# Altium footprint library EMDC_Packages.PcbLib: 274 footprints (part 5 of 18)
Each footprint in its own frame and in the unit in brackets; x right, y up, seen from the top. Pads: shape width x height; smd on the part's side, far side on the other; paste and mask are expansions set on the pad; w line width, h text height; cw(c..) or ccw(c..) is an arc to the next point about the centre after c.
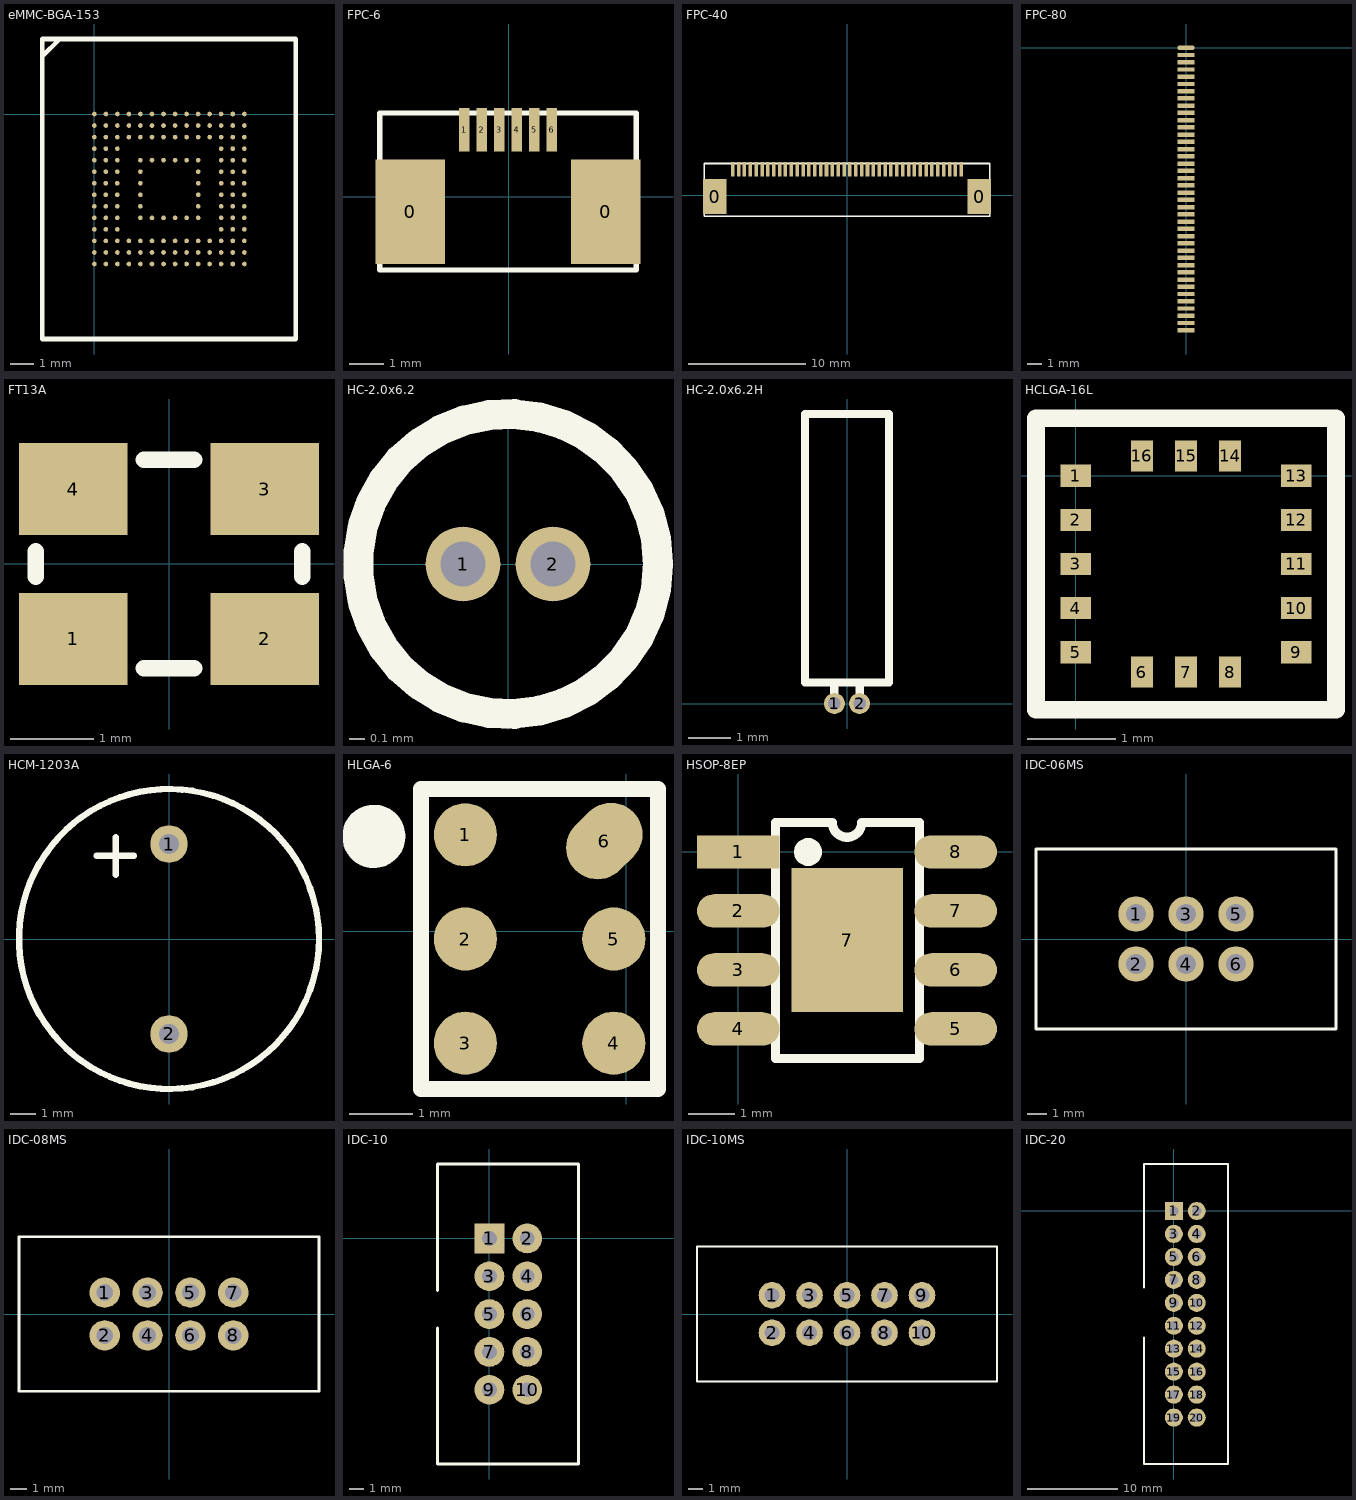
[diagram p4: the footprints below, top view; thin cyan lines are the x and y axes]

## eMMC-BGA-153 [mm]
pads (152):
  round 0.2 smd: A1(0,0) A2(0.5,0) A3(1,0) A4(1.5,0) A5(2,0) A6(2.5,0) A7(3,0) A8(3.5,0) A9(4,0) A10(4.5,0) A11(5,0) A12(5.5,0) A13(6,0) A14(6.5,0) B1(0,-0.5) B2(0.5,-0.5) B3(1,-0.5) B4(1.5,-0.5) B5(2,-0.5) B6(2.5,-0.5) B7(3,-0.5) B8(3.5,-0.5) B9(4,-0.5) B10(4.5,-0.5) B11(5,-0.5) B12(5.5,-0.5) B13(6,-0.5) B14(6.5,-0.5) C1(0,-1) C2(0.5,-1) C3(1,-1) C4(1.5,-1) C5(2,-1) C6(2.5,-1) C7(3,-1) C8(3.5,-1) C9(4,-1) C10(4.5,-1) C11(5,-1) C12(5.5,-1) C13(6,-1) C14(6.5,-1) D1(0,-1.5) D2(0.5,-1.5) D3(1,-1.5) D12(5.5,-1.5) D13(6,-1.5) D14(6.5,-1.5) E1(0,-2) E2(0.5,-2) E3(1,-2) E5(2,-2) E6(2.5,-2) E7(3,-2) E8(3.5,-2) E9(4,-2) E10(4.5,-2) E12(5.5,-2) E13(6,-2) E14(6.5,-2) F1(0,-2.5) F2(0.5,-2.5) F3(1,-2.5) F5(2,-2.5) F10(4.5,-2.5) F12(5.5,-2.5) F13(6,-2.5) F14(6.5,-2.5) G1(0,-3) G2(0.5,-3) G3(1,-3) G5(2,-3) G10(4.5,-3) G12(5.5,-3) G13(6,-3) G14(6.5,-3) H1(0,-3.5) H2(0.5,-3.5) H3(1,-3.5) H5(2,-3.5) H10(4.5,-3.5) H12(5.5,-3.5) H13(6,-3.5) H14(6.5,-3.5) J1(0,-4) J2(0.5,-4) J3(1,-4) J5(2,-4) J10(4.5,-4) J12(5.5,-4) J13(6,-4) J14(6.5,-4) K1(0,-4.5) K2(0.5,-4.5) K3(1,-4.5) K5(2,-4.5) K6(2.5,-4.5) K7(3,-4.5) K8(3.5,-4.5) K9(4,-4.5) K10(4.5,-4.5) K12(5.5,-4.5) K13(6,-4.5) K14(6.5,-4.5) L1(0,-5) L2(0.5,-5) L3(1,-5) L12(5.5,-5) L13(6,-5) L14(6.5,-5) M1(0,-5.5) M2(0.5,-5.5) M3(1,-5.5) M4(1.5,-5.5) M5(2,-5.5) M6(2.5,-5.5) M7(3,-5.5) M8(3.5,-5.5) M9(4,-5.5) M10(4.5,-5.5) M11(5,-5.5) M12(5.5,-5.5) M13(6,-5.5) M14(6.5,-5.5) N1(0,-6) N2(0.5,-6) N3(1,-6) N4(1.5,-6) N5(2,-6) N6(2.5,-6) N7(3,-6) N8(3.5,-6) N9(4,-6) N10(4.5,-6) N11(5,-6) N12(5.5,-6) N13(6,-6) N14(6.5,-6) P1(0,-6.5) P2(0.5,-6.5) P3(1,-6.5) P4(1.5,-6.5) P5(2,-6.5) P6(2.5,-6.5) P7(3,-6.5) P8(3.5,-6.5) P9(4,-6.5) P10(4.5,-6.5) P11(5,-6.5) P12(5.5,-6.5) P13(6,-6.5) P14(6.5,-6.5)
Top Overlay:
  lines w0.2: -2.25,2.5 -1.5,3.25 ; -2.25,3.25 -2.25,3.25 ; -2.25,3.25 8.725,3.25 8.725,-9.75 -2.25,-9.75 -2.25,3.25
3D body "User Library-FBGA64 11x13.step": height 1.4, standoff 0, extent -2.25,-9.75 8.75,3.25

## FPC-6 [mm]
pads (8):
  rect 2x3 smd: 0(-2.825,-0.425) 0(2.775,-0.425)
  rect 0.3x1.25 smd: 1(-1.275,1.925) 2(-0.775,1.925) 3(-0.275,1.925) 4(0.225,1.925) 5(0.725,1.925) 6(1.225,1.925)
Top Overlay:
  lines w0.15: -3.7,2.4 -3.7,2.4 ; -3.7,2.4 -3.7,-2.1 3.65,-2.1 3.65,2.4 -3.7,2.4
3D body "31826.stp": height 1.03, standoff 0.03, extent -2.525,-1.4 2.475,2.4

## FPC-40 [mm]
pads (42):
  rect 2x3 smd: 0(-11.325,-0.1) 0(11.275,-0.1)
  rect 0.3x1.25 smd: 1(-9.775,2.25) 2(-9.275,2.25) 3(-8.775,2.25) 4(-8.275,2.25) 5(-7.775,2.25) 6(-7.275,2.25) 7(-6.775,2.25) 8(-6.275,2.25) 9(-5.775,2.25) 10(-5.275,2.25) 11(-4.775,2.25) 12(-4.275,2.25) 13(-3.775,2.25) 14(-3.275,2.25) 15(-2.775,2.25) 16(-2.275,2.25) 17(-1.775,2.25) 18(-1.275,2.25) 19(-0.775,2.25) 20(-0.275,2.25) 21(0.225,2.25) 22(0.725,2.25) 23(1.225,2.25) 24(1.725,2.25) 25(2.225,2.25) 26(2.725,2.25) 27(3.225,2.25) 28(3.725,2.25) 29(4.225,2.25) 30(4.725,2.25) 31(5.225,2.25) 32(5.725,2.25) 33(6.225,2.25) 34(6.725,2.25) 35(7.225,2.25) 36(7.725,2.25) 37(8.225,2.25) 38(8.725,2.25) 39(9.225,2.25) 40(9.725,2.25)
Top Overlay:
  lines w0.15: -12.2,2.725 -12.2,2.725 ; -12.2,2.725 -12.2,-1.775 12.15,-1.775 ; -12.2,2.725 12.15,2.725 12.15,-1.775 ; 12.15,-1.775 12.15,-1.775
3D body "31805.stp": height 2.5, standoff -0.05, extent -12.5,-4.35 12.4,2.85

## FPC-80 [mm]
pads (40):
  oval 1.2x0.3 smd: 1(0,0)
  rect 1.2x0.3 smd: 2(0,-0.5) 3(0,-1) 4(0,-1.5) 5(0,-2) 6(0,-2.5) 7(0,-3) 8(0,-3.5) 9(0,-4) 10(0,-4.5) 11(0,-5) 12(0,-5.5) 13(0,-6) 14(0,-6.5) 15(0,-7) 16(0,-7.5) 17(0,-8) 18(0,-8.5) 19(0,-9) 20(0,-9.5) 21(0,-10) 22(0,-10.5) 23(0,-11) 24(0,-11.5) 25(0,-12) 26(0,-12.5) 27(0,-13) 28(0,-13.5) 29(0,-14) 30(0,-14.5) 31(0,-15) 32(0,-15.5) 33(0,-16) 34(0,-16.5) 35(0,-17) 36(0,-17.5) 37(0,-18) 38(0,-18.5) 39(0,-19) 40(0,-19.5)

## FT13A [mm] "Quartz crystal FT13A package"
pads (4):
  rect 1.3x1.1 smd: 1(-1.15,-0.9) 2(1.15,-0.9) 3(1.15,0.9) 4(-1.15,0.9)
Top Overlay:
  lines w0.2: -1.6,-0.15 -1.6,0.15 ; -0.3,-1.25 0.3,-1.25 ; -0.3,1.25 0.3,1.25 ; 1.6,-0.15 1.6,0.15
3D body: height 0.7, standoff 0, extent -1.599,-1.249 1.599,1.249

## HC-2.0x6.2 [mm]
pads (2):
  round 0.5 hole 0.3: 1(-0.3,0) 2(0.3,0)
Top Overlay:
  circle w0.2: c0,0 r1
3D body: height 6.2, standoff 0, extent -1,-0.999 1,0.999

## HC-2.0x6.2H [mm]
pads (2):
  round 0.5 hole 0.3: 1(-0.3,0) 2(0.3,0)
Top Overlay:
  lines w0.2: -0.3,0 -0.3,0.5 ; 0.3,0 0.3,0.5 ; -1,0.5 1,0.5 1,6.9 -1,6.9 -1,0.5
3D body: height 1, standoff 0, extent 0.1,-0.2 0.5,0.2
3D body: height 1, standoff 0, extent -0.5,-0.2 -0.1,0.2
3D body: height 1.2, standoff 0.8, extent 0.1,0.1 0.5,0.6
3D body: height 1.2, standoff 0.8, extent -0.5,0.1 -0.1,0.6
3D body: height 2, standoff 0, extent -0.9,0.6 1.1,6.8
3D body: height 1.2, standoff 0.71, extent -0.5,-0.141 -0.1,0.353
3D body: height 1.2, standoff 0.71, extent 0.1,-0.141 0.5,0.353

## HCLGA-16L [mm]
pads (16):
  rect 0.35x0.25 smd: 1(0,0) 2(0,-0.5) 3(0,-1) 4(0,-1.5) 5(0,-2) 9(2.5,-2) 10(2.5,-1.5) 11(2.5,-1) 12(2.5,-0.5) 13(2.5,0)
  rect 0.25x0.35 smd: 6(0.75,-2.225) 7(1.25,-2.225) 8(1.75,-2.225) 14(1.75,0.225) 15(1.25,0.225) 16(0.75,0.225)
Top Overlay:
  lines w0.2: -0.45,-2.65 2.95,-2.65 2.95,0.65 -0.45,0.65 -0.45,-2.65
3D body "User Library-LIS331AL.STEP": height 1.01, standoff -0.01, extent -0.25,-2.5 2.75,0.5

## HCM-1203A [mm] "Buzzer"
pads (2):
  round 1.5 hole 0.8: 1(0,3.8) 2(0,-3.8)
Top Overlay:
  circle w0.254: c0,0 r6
  lines w0.254: -2.9,3.325 -1.4,3.325 ; -2.125,2.575 -2.125,4.075
3D body "User Library-HCM1206X.STEP": height 9.5, standoff -6.5, extent -6,-6 6,6

## HLGA-6 [mm]
pads (6):
  round 1 smd: 1(-2.55,1.525) 2(-2.55,-0.125) 3(-2.55,-1.775) 4(-0.2,-1.775) 5(-0.2,-0.125)
  oval 1x1.3 smd rot 135: 6(-0.35,1.425)
Top Overlay:
  circle w0.5: c-4,1.5 r0.25
  lines w0.254: -3.25,-2.5 -3.25,2.25 0.5,2.25 0.5,-2.5 -3.25,-2.5

## HSOP-8EP [mm]
pads (9):
  rect 1.78x0.72 smd: 1(0,0)
  oval 1.78x0.72 smd: 2(0,-1.27) 3(0,-2.54) 4(0,-3.81) 5(4.68,-3.81) 6(4.68,-2.54) 7(4.68,-1.27) 8(4.68,0)
  rect 2.4x3.1 smd: 7(2.35,-1.9)
Top Overlay:
  circle w0.3: c1.5,0 r0.15
  lines w0.2: 0.8,-4.445 3.9,-4.445 3.9,0.635 2.658,0.635 cw(c2.34,0.635) 2.023,0.635 0.8,0.635 0.8,-4.445

## IDC-06MS [mm]
pads (6):
  round 1.8 hole 1: 1(-2.54,1.27) 2(-2.54,-1.27) 3(0,1.27) 4(0,-1.27) 5(2.54,1.27) 6(2.54,-1.27)
Top Overlay:
  lines w0.15: -7.62,-4.572 -7.62,4.572 7.62,4.572 7.62,-4.572 -7.62,-4.572

## IDC-08MS [mm]
pads (8):
  round 1.8 hole 1: 1(-3.81,1.27) 2(-3.81,-1.27) 3(-1.27,1.27) 4(-1.27,-1.27) 5(1.27,1.27) 6(1.27,-1.27) 7(3.81,1.27) 8(3.81,-1.27)
Top Overlay:
  lines w0.15: -8.89,-4.572 8.89,-4.572 8.89,4.572 -8.89,4.572 -8.89,-4.572

## IDC-10 [mm] "IDC-10 Male Connector"
height 9
pads (10):
  rect 2x2 hole 1: 1(0,0)
  round 2 hole 1: 2(2.54,0) 3(0,-2.54) 4(2.54,-2.54) 5(0,-5.08) 6(2.54,-5.08) 7(0,-7.62) 8(2.54,-7.62) 9(0,-10.16) 10(2.54,-10.16)
Top Overlay:
  lines w0.2: -3.5,-6 -3.5,-15.15 6,-15.15 6,5 -3.5,5 -3.5,-3.5
3D body "User Library-BH-10__64BH-10.STEP": height 9.1, standoff -3, extent -3.28,-15.33 6.02,5.17

## IDC-10MS [mm]
pads (10):
  round 1.8 hole 1: 1(-5.08,1.27) 2(-5.08,-1.27) 3(-2.54,1.27) 4(-2.54,-1.27) 5(0,1.27) 6(0,-1.27) 7(2.54,1.27) 8(2.54,-1.27) 9(5.08,1.27) 10(5.08,-1.27)
Top Overlay:
  lines w0.15: -10.16,-4.572 10.16,-4.572 10.16,4.572 -10.16,4.572 -10.16,-4.572
3D body "User Library-BH-10__64BH-10.STEP": height 9.1, standoff -3, extent -10.25,-4.75 10.25,4.55

## IDC-20 [mm] "IDC-20 Male Connector"
height 9
pads (20):
  rect 2x2 hole 1: 1(0,0)
  round 2 hole 1: 2(2.54,0) 3(0,-2.54) 4(2.54,-2.54) 5(0,-5.08) 6(2.54,-5.08) 7(0,-7.62) 8(2.54,-7.62) 9(0,-10.16) 10(2.54,-10.16) 11(0,-12.7) 12(2.54,-12.7) 13(0,-15.24) 14(2.54,-15.24) 15(0,-17.78) 16(2.54,-17.78) 17(0,-20.32) 18(2.54,-20.32) 19(0,-22.86) 20(2.54,-22.86)
Top Overlay:
  lines w0.2: -3.3,-14 -3.3,-28 6,-28 6,5.2 -3.3,5.2 -3.3,-8.5
3D body "User Library-BH-10__64BH-20.STEP": height 9.1, standoff -3, extent -3.3,-28 6,5.2